# Altium footprint library alex_footprint.PcbLib: 262 footprints (part 8 of 17)
Each footprint in its own frame and in the unit in brackets; x right, y up, seen from the top. Pads: shape width x height; smd on the part's side, far side on the other; paste and mask are expansions set on the pad; w line width, h text height; cw(c..) or ccw(c..) is an arc to the next point about the centre after c.
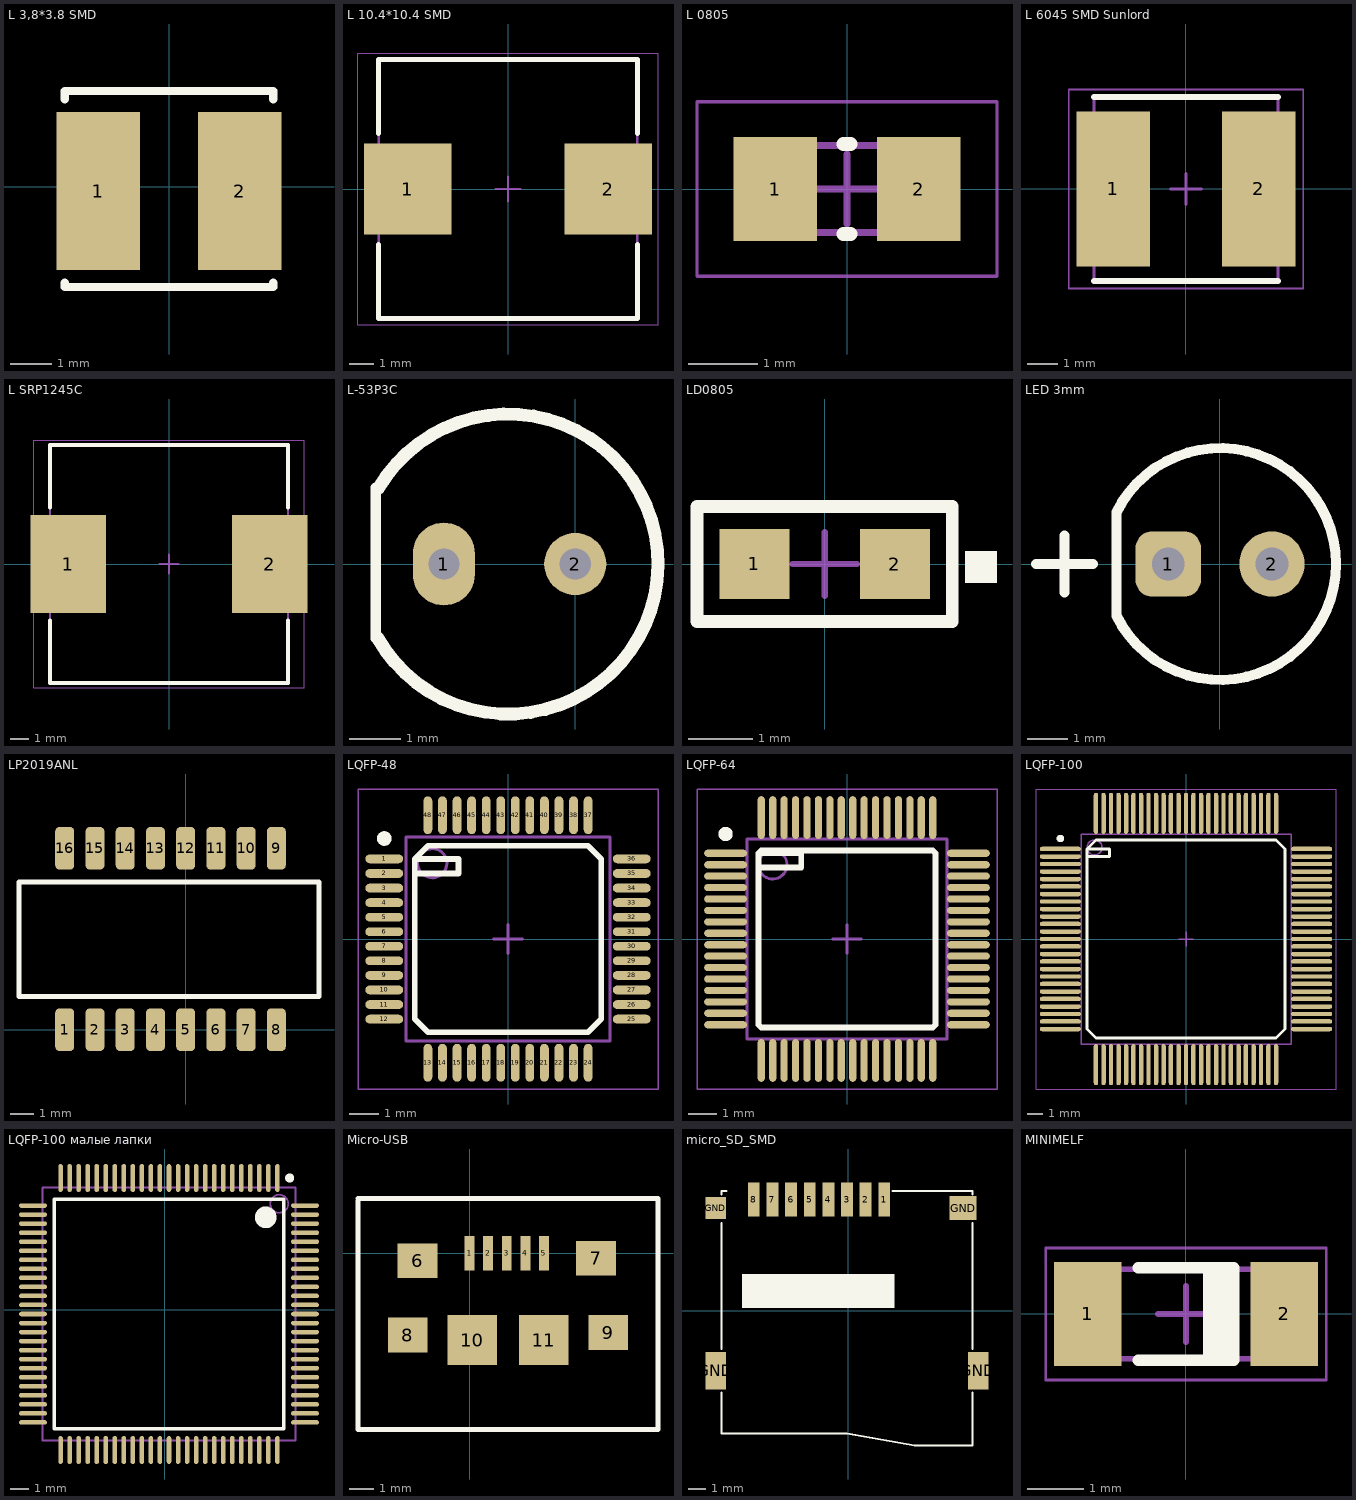
[diagram p7: the footprints below, top view; thin cyan lines are the x and y axes]

## L 3,8*3.8 SMD [mm]
pads (2):
  rect 2x3.8 smd: 1(-1.7,-0.1) 2(1.7,-0.1)
Top Overlay:
  lines w0.2: -2.5,-2.3 -2.5,-2.4 2.5,-2.4 2.5,-2.3 ; -2.5,2.1 -2.5,2.3 2.5,2.3 2.5,2.1

## L 10.4*10.4 SMD [mm]
height 4.8
pads (2):
  rect 3.5x3.65 smd: 1(-4.025,0) 2(4.025,0)
Top Overlay:
  lines w0.2: -5.2,-2.225 -5.2,-5.2 5.2,-5.2 5.2,-2.225 ; -5.2,2.225 -5.2,5.2 5.2,5.2 5.2,2.225
Mechanical 13:
  lines w0.1: -5.2,-5.2 -5.2,5.2 5.2,5.2 5.2,-5.2 -5.2,-5.2
Mechanical 15:
  lines w0.05: -6.025,-5.45 -6.025,5.45 6.025,5.45 6.025,-5.45 -6.025,-5.45
  lines w0.1: -0.5,0 0.5,0 ; 0,-0.5 0,0.5
3D body: height 4.8, standoff 0, extent -5.2,-5.2 5.2,5.2

## L 0805 [mm]
height 1.4
pads (2):
  rect 1.2x1.49 smd: 1(-1.03,0) 2(1.03,0)
Top Overlay:
  lines w0.2: -0.05,-0.645 0.05,-0.645 ; -0.05,0.645 0.05,0.645
Mechanical 13:
  lines w0.1: -1,-0.625 -1,0.625 1,0.625 1,-0.625 -1,-0.625
Mechanical 15:
  lines w0.05: -2.15,-1.25 -2.15,1.25 2.15,1.25 2.15,-1.25 -2.15,-1.25
  lines w0.1: -0.5,0 0.5,0 ; 0,-0.5 0,0.5
3D body: height 1.4, standoff 0, extent -0.5,-0.625 0.5,0.625
3D body: height 1.4, standoff 0, extent -1,-0.625 -0.5,0.625
3D body: height 1.4, standoff 0, extent 0.5,-0.625 1,0.625

## L 6045 SMD Sunlord [mm]
height 4.5
pads (2):
  rect 2.4x5.05 smd: 1(-2.375,0) 2(2.375,0)
Top Overlay:
  lines w0.2: -3,-3 3,-3 ; -3,3 3,3
Mechanical 13:
  lines w0.1: -3,-3 -3,3 3,3 3,-3 -3,-3
Mechanical 15:
  lines w0.05: -3.825,-3.25 -3.825,3.25 3.825,3.25 3.825,-3.25 -3.825,-3.25
  lines w0.1: -0.5,0 0.5,0 ; 0,-0.5 0,0.5
3D body: height 4.5, standoff 0, extent -3,-3 3,3

## L SRP1245C [mm]
height 5
pads (2):
  rect 4x5.2 smd: 1(-5.35,0) 2(5.35,0)
Top Overlay:
  lines w0.2: -6.3,-3 -6.3,-6.3 6.3,-6.3 6.3,-3 ; -6.3,3 -6.3,6.3 6.3,6.3 6.3,3
Mechanical 13:
  lines w0.1: -6.3,-6.3 6.3,-6.3 6.3,6.3 -6.3,6.3 -6.3,-6.3
Mechanical 15:
  lines w0.05: -7.175,-6.55 7.175,-6.55 7.175,6.55 -7.175,6.55 -7.175,-6.55
  lines w0.1: -0.5,0 0.5,0 ; 0,-0.5 0,0.5
3D body: height 5, standoff 0, extent -6.3,-6.3 6.3,6.3

## L-53P3C [mm]
pads (2):
  oval 1.2x1.6 hole 0.6 unplated: 1(-2.54,0)
  round 1.2 hole 0.6 unplated: 2(0,0)
Top Overlay:
  lines w0.2: -3.858,1.473 -3.858,-1.438 -3.759,-1.537
  lines w0.25: -3.828,-1.421 ccw(c-1.3,0) -3.798,1.473

## LD0805 [mm]
height 2
pads (2):
  rect 1.1x1.1 smd: 1(-1.1,0) 2(1.1,0)
Top Overlay:
  rectangle: 2.2,-0.3 2.7,0.2
  lines w0.2: -2,-0.9 1,-0.9 2,-0.9 2,0.9 1,0.9 -2,0.9 -2,-0.9
Mechanical 7:
  lines w0.05: -2,-0.9 -2,0.9 2,0.9 2,-0.9 -2,-0.9
  text ".Designator" at -2,1.5 h1.5
Mechanical 15:
  lines w0.1: -0.5,0 0.5,0 ; 0,-0.5 0,0.5 ; -2,-0.9 -2,0.9 2,0.9 2,-0.9 -2,-0.9
3D body "LED_2012_075.STEP": height 0.73, standoff -0.02, extent -1,-0.625 1,0.625

## LED 3mm [mm]
pads (2):
  rrect50% 1.6x1.6 hole 0.8 unplated: 1(-1.26,0)
  round 1.6 hole 0.8 unplated: 2(1.28,0)
Top Overlay:
  lines w0.25: -4.5,0 -3.1,0 ; -3.8,-0.7 -3.8,0.7 ; -2.53,-1.27 ccw(c0.01,0) -2.53,1.27 -2.53,-1.27

## LP2019ANL [mm]
pads (16):
  rrect50% 0.8x1.8 smd mask+0.25: 1(-5.08,0) 2(-3.81,0) 3(-2.54,0) 4(-1.27,0) 5(0,0) 6(1.27,0) 7(2.54,0) 8(3.81,0) 9(3.81,7.62) 10(2.54,7.62) 11(1.27,7.62) 12(0,7.62) 13(-1.27,7.62) 14(-2.54,7.62) 15(-3.81,7.62) 16(-5.08,7.62)
Top Overlay:
  lines w0.2: -7,1.4 -5.1,1.4 5.6,1.4 5.6,6.2 -7,6.2 -7,1.4

## LQFP-48 [mm] "CQFP, 48-Leads, Body 9,00x9,00mm, Pitch 0,50mm, IPC Medium Density"
height 1.6
pads (48):
  oval 1.3x0.3 smd: 1(-4.25,2.75) 2(-4.25,2.25) 3(-4.25,1.75) 4(-4.25,1.25) 5(-4.25,0.75) 6(-4.25,0.25) 7(-4.25,-0.25) 8(-4.25,-0.75) 9(-4.25,-1.25) 10(-4.25,-1.75) 11(-4.25,-2.25) 12(-4.25,-2.75) 25(4.25,-2.75) 26(4.25,-2.25) 27(4.25,-1.75) 28(4.25,-1.25) 29(4.25,-0.75) 30(4.25,-0.25) 31(4.25,0.25) 32(4.25,0.75) 33(4.25,1.25) 34(4.25,1.75) 35(4.25,2.25) 36(4.25,2.75)
  oval 0.3x1.3 smd: 13(-2.75,-4.25) 14(-2.25,-4.25) 15(-1.75,-4.25) 16(-1.25,-4.25) 17(-0.75,-4.25) 18(-0.25,-4.25) 19(0.25,-4.25) 20(0.75,-4.25) 21(1.25,-4.25) 22(1.75,-4.25) 23(2.25,-4.25) 24(2.75,-4.25) 37(2.75,4.25) 38(2.25,4.25) 39(1.75,4.25) 40(1.25,4.25) 41(0.75,4.25) 42(0.25,4.25) 43(-0.25,4.25) 44(-0.75,4.25) 45(-1.25,4.25) 46(-1.75,4.25) 47(-2.25,4.25) 48(-2.75,4.25)
Top Overlay:
  circle w0.25: c-4.25,3.45 r0.125
  lines w0.2: -3.2,2.25 -1.7,2.25 -1.7,2.75 -3.2,2.75 ; -3.2,2.75 -2.75,3.2 2.75,3.2 3.2,2.75 3.2,-2.75 2.75,-3.2 -2.75,-3.2 -3.2,-2.75 -3.2,2.75
Mechanical 13:
  circle w0.1: c-2.6,2.6 r0.5
  lines w0.1: -3.5,-3.5 3.5,-3.5 3.5,3.5 -3.5,3.5 -3.5,-3.5
Mechanical 15:
  lines w0.05: -5.15,-5.15 5.15,-5.15 5.15,5.15 -5.15,5.15 -5.15,-5.15
  lines w0.1: -0.5,0 0.5,0 ; 0,-0.5 0,0.5
3D body: height 1.6, standoff 0.15, extent -3.5,-3.5 3.5,3.5

## LQFP-64 [mm]
height 1.6
pads (64):
  oval 1.5x0.25 smd: 1(-4.25,3) 2(-4.25,2.6) 3(-4.25,2.2) 4(-4.25,1.8) 5(-4.25,1.4) 6(-4.25,1) 7(-4.25,0.6) 8(-4.25,0.2) 9(-4.25,-0.2) 10(-4.25,-0.6) 11(-4.25,-1) 12(-4.25,-1.4) 13(-4.25,-1.8) 14(-4.25,-2.2) 15(-4.25,-2.6) 16(-4.25,-3) 33(4.25,-3) 34(4.25,-2.6) 35(4.25,-2.2) 36(4.25,-1.8) 37(4.25,-1.4) 38(4.25,-1) 39(4.25,-0.6) 40(4.25,-0.2) 41(4.25,0.2) 42(4.25,0.6) 43(4.25,1) 44(4.25,1.4) 45(4.25,1.8) 46(4.25,2.2) 47(4.25,2.6) 48(4.25,3)
  oval 0.25x1.5 smd: 17(-3,-4.25) 18(-2.6,-4.25) 19(-2.2,-4.25) 20(-1.8,-4.25) 21(-1.4,-4.25) 22(-1,-4.25) 23(-0.6,-4.25) 24(-0.2,-4.25) 25(0.2,-4.25) 26(0.6,-4.25) 27(1,-4.25) 28(1.4,-4.25) 29(1.8,-4.25) 30(2.2,-4.25) 31(2.6,-4.25) 32(3,-4.25) 49(3,4.25) 50(2.6,4.25) 51(2.2,4.25) 52(1.8,4.25) 53(1.4,4.25) 54(1,4.25) 55(0.6,4.25) 56(0.2,4.25) 57(-0.2,4.25) 58(-0.6,4.25) 59(-1,4.25) 60(-1.4,4.25) 61(-1.8,4.25) 62(-2.2,4.25) 63(-2.6,4.25) 64(-3,4.25)
Top Overlay:
  circle w0.25: c-4.25,3.675 r0.125
  lines w0.2: -3.1,2.5 -1.6,2.5 -1.6,3 -3.1,3 ; -3.1,3 -3,3.1 3,3.1 3.1,3 3.1,-3 3,-3.1 -3,-3.1 -3.1,-3 -3.1,3
Mechanical 13:
  circle w0.1: c-2.6,2.6 r0.5
  lines w0.1: -3.5,-3.5 3.5,-3.5 3.5,3.5 -3.5,3.5 -3.5,-3.5
Mechanical 15:
  lines w0.05: -5.25,-5.25 5.25,-5.25 5.25,5.25 -5.25,5.25 -5.25,-5.25
  lines w0.1: -0.5,0 0.5,0 ; 0,-0.5 0,0.5
3D body: height 1.6, standoff 0.15, extent -3.5,-3.5 3.5,3.5

## LQFP-100 [mm] "CQFP, 100-Leads, Body 18,70x18,70mm, Pitch 0,50mm, IPC Medium Density"
height 1.5
pads (100):
  oval 2.75x0.3 smd: 1(-8.375,6) 2(-8.375,5.5) 3(-8.375,5) 4(-8.375,4.5) 5(-8.375,4) 6(-8.375,3.5) 7(-8.375,3) 8(-8.375,2.5) 9(-8.375,2) 10(-8.375,1.5) 11(-8.375,1) 12(-8.375,0.5) 13(-8.375,0) 14(-8.375,-0.5) 15(-8.375,-1) 16(-8.375,-1.5) 17(-8.375,-2) 18(-8.375,-2.5) 19(-8.375,-3) 20(-8.375,-3.5) 21(-8.375,-4) 22(-8.375,-4.5) 23(-8.375,-5) 24(-8.375,-5.5) 25(-8.375,-6) 51(8.375,-6) 52(8.375,-5.5) 53(8.375,-5) 54(8.375,-4.5) 55(8.375,-4) 56(8.375,-3.5) 57(8.375,-3) 58(8.375,-2.5) 59(8.375,-2) 60(8.375,-1.5) 61(8.375,-1) 62(8.375,-0.5) 63(8.375,0) 64(8.375,0.5) 65(8.375,1) 66(8.375,1.5) 67(8.375,2) 68(8.375,2.5) 69(8.375,3) 70(8.375,3.5) 71(8.375,4) 72(8.375,4.5) 73(8.375,5) 74(8.375,5.5) 75(8.375,6)
  oval 0.3x2.75 smd: 26(-6,-8.375) 27(-5.5,-8.375) 28(-5,-8.375) 29(-4.5,-8.375) 30(-4,-8.375) 31(-3.5,-8.375) 32(-3,-8.375) 33(-2.5,-8.375) 34(-2,-8.375) 35(-1.5,-8.375) 36(-1,-8.375) 37(-0.5,-8.375) 38(0,-8.375) 39(0.5,-8.375) 40(1,-8.375) 41(1.5,-8.375) 42(2,-8.375) 43(2.5,-8.375) 44(3,-8.375) 45(3.5,-8.375) 46(4,-8.375) 47(4.5,-8.375) 48(5,-8.375) 49(5.5,-8.375) 50(6,-8.375) 76(6,8.375) 77(5.5,8.375) 78(5,8.375) 79(4.5,8.375) 80(4,8.375) 81(3.5,8.375) 82(3,8.375) 83(2.5,8.375) 84(2,8.375) 85(1.5,8.375) 86(1,8.375) 87(0.5,8.375) 88(0,8.375) 89(-0.5,8.375) 90(-1,8.375) 91(-1.5,8.375) 92(-2,8.375) 93(-2.5,8.375) 94(-3,8.375) 95(-3.5,8.375) 96(-4,8.375) 97(-4.5,8.375) 98(-5,8.375)
  oval 0.3x2.75 smd paste+0: 99(-5.5,8.375) 100(-6,8.375)
Top Overlay:
  circle w0.25: c-8.375,6.7 r0.125
  lines w0.2: -6.6,5.5 -5.1,5.5 -5.1,6 -6.6,6 ; -6.6,6 -6.6,-6 -6,-6.6 6,-6.6 6.6,-6 6.6,6 6,6.6 -6,6.6 -6.6,6
Mechanical 13:
  circle w0.1: c-6.1,6.1 r0.5
  lines w0.1: -7,-7 -7,7 7,7 7,-7 -7,-7
Mechanical 15:
  lines w0.05: -10,-10 -10,10 10,10 10,-10 -10,-10
  lines w0.1: -0.5,0 0.5,0 ; 0,-0.5 0,0.5
3D body: height 1.5, standoff 1.5, extent -7,-7 7,7

## LQFP-100 малые лапки [mm]
pads (100):
  oval 0.25x1.55 smd: 1(6.238,7.3) 2(5.738,7.3) 3(5.238,7.3) 4(4.738,7.3) 5(4.238,7.3) 6(3.738,7.3) 7(3.238,7.3) 8(2.738,7.3) 9(2.238,7.3) 10(1.738,7.3) 11(1.238,7.3) 12(0.738,7.3) 13(0.238,7.3) 14(-0.262,7.3) 15(-0.762,7.3) 16(-1.262,7.3) 17(-1.762,7.3) 18(-2.262,7.3) 19(-2.762,7.3) 20(-3.262,7.3) 21(-3.762,7.3) 22(-4.262,7.3) 23(-4.762,7.3) 24(-5.262,7.3) 25(-5.762,7.3) 51(-5.762,-7.75) 52(-5.262,-7.75) 53(-4.762,-7.75) 54(-4.262,-7.75) 55(-3.762,-7.75) 56(-3.262,-7.75) 57(-2.762,-7.75) 58(-2.262,-7.75) 59(-1.762,-7.75) 60(-1.262,-7.75) 61(-0.762,-7.75) 62(-0.262,-7.75) 63(0.238,-7.75) 64(0.738,-7.75) 65(1.238,-7.75) 66(1.738,-7.75) 67(2.238,-7.75) 68(2.738,-7.75) 69(3.238,-7.75) 70(3.738,-7.75) 71(4.238,-7.75) 72(4.738,-7.75) 73(5.238,-7.75) 74(5.738,-7.75) 75(6.238,-7.75)
  oval 1.55x0.25 smd: 26(-7.287,5.775) 27(-7.287,5.275) 28(-7.287,4.775) 29(-7.287,4.275) 30(-7.287,3.775) 31(-7.287,3.275) 32(-7.287,2.775) 33(-7.287,2.275) 34(-7.287,1.775) 35(-7.287,1.275) 36(-7.287,0.775) 37(-7.287,0.275) 38(-7.287,-0.225) 39(-7.287,-0.725) 40(-7.287,-1.225) 41(-7.287,-1.725) 42(-7.287,-2.225) 43(-7.287,-2.725) 44(-7.287,-3.225) 45(-7.287,-3.725) 46(-7.287,-4.225) 47(-7.287,-4.725) 48(-7.287,-5.225) 49(-7.287,-5.725) 50(-7.287,-6.225) 76(7.763,-6.225) 77(7.763,-5.725) 78(7.763,-5.225) 79(7.763,-4.725) 80(7.763,-4.225) 81(7.763,-3.725) 82(7.763,-3.225) 83(7.763,-2.725) 84(7.763,-2.225) 85(7.763,-1.725) 86(7.763,-1.225) 87(7.763,-0.725) 88(7.763,-0.225) 89(7.763,0.275) 90(7.763,0.775) 91(7.763,1.275) 92(7.763,1.775) 93(7.763,2.275) 94(7.763,2.775) 95(7.763,3.275) 96(7.763,3.775) 97(7.763,4.275) 98(7.763,4.775) 99(7.763,5.275) 100(7.763,5.775)
Top Overlay:
  circle w0.25: c6.913,7.3 r0.125
  circle w0.6: c5.588,5.125 r0.3
  lines w0.2: -6.112,-6.575 6.588,-6.575 6.588,6.125 -6.112,6.125 -6.112,-6.575
Mechanical 13:
  circle w0.1: c6.338,5.875 r0.5
  lines w0.1: -6.762,-7.225 7.238,-7.225 7.238,6.775 -6.762,6.775 -6.762,-7.225
3D body: height 1.6, standoff 0, extent -6.762,-7.225 7.238,6.775

## Micro-USB [mm]
pads (11):
  rect 0.4x1.4 smd: 1(0,0) 2(0.75,0) 3(1.5,0) 4(2.25,0) 5(3,0)
  rect 1.6x1.4 smd: 6(-2.1,-0.3) 7(5.1,-0.2) 8(-2.5,-3.3) 9(5.6,-3.2)
  rect 2x2 smd: 10(0.1,-3.5) 11(3,-3.5)
Top Overlay:
  lines w0.2: -4.5,2.1 -4.5,-7.1 7.6,-7.1 7.6,2.2 -4.5,2.2
Mechanical 7:
  text ".Designator" at -1.5,3.2 h1.5

## micro_SD_SMD [mm]
pads (12):
  rect 0.7x2 smd mask+0.051: 1(2.123,6.55) 2(1.023,6.55) 3(-0.077,6.55) 4(-1.177,6.55) 5(-2.277,6.55) 6(-3.377,6.55) 7(-4.477,6.55) 8(-5.577,6.55)
  rect 1.2x2.2 smd mask+0.051: GND(-7.827,-3.55) GND(7.673,-3.55)
  rect 1.2x1.3 smd mask+0.051: GND(-7.827,6.05)
  rect 1.6x1.4 smd mask+0.051: GND(6.773,6.05)
Top Overlay:
  rectangle: -6.277,0.15 2.723,2.15
  lines w0.127: -7.477,-4.85 -7.477,-7.25 -0.077,-7.25 3.923,-7.95 7.323,-7.95 7.323,-4.85 ; -7.477,-2.25 -7.477,5.15 ; -7.477,6.85 -7.477,7.05 -7.177,7.05 ; 2.623,7.05 7.323,7.05 7.323,6.85 ; 7.323,-2.25 7.323,5.15

## MINIMELF [mm] "MELF Diode, 2-Leads, Body 3,50x1,60mm, IPC Medium Density"
height 1.6
pads (2):
  rect 1.2x1.85 smd: 1(-1.75,0) 2(1.75,0)
Top Overlay:
  rectangle: 0.3,-0.825 0.85,0.825
  lines w0.2: -0.85,-0.825 0.85,-0.825 0.85,0.825 -0.85,0.825
Mechanical 13:
  lines w0.1: -1.85,-0.8 1.85,-0.8 1.85,0.8 -1.85,0.8 -1.85,-0.8
Mechanical 15:
  lines w0.05: -2.5,-1.175 2.5,-1.175 2.5,1.175 -2.5,1.175 -2.5,-1.175
  lines w0.1: -0.5,0 0.5,0 ; 0,-0.5 0,0.5
3D body: height 1.6, standoff 0, extent 1.55,-0.8 1.85,0.8
3D body: height 1.59, standoff 0.04, extent -1.55,-0.77 1.55,0.77
3D body: height 1.59, standoff 0.04, extent 0.35,-0.771 0.95,0.771
3D body: height 1.6, standoff 0, extent -1.85,-0.8 -1.55,0.8